# Altium footprint library std-th.PcbLib: 245 footprints (part 1 of 16)
Each footprint in its own frame and in the unit in brackets; x right, y up, seen from the top. Pads: shape width x height; smd on the part's side, far side on the other; paste and mask are expansions set on the pad; w line width, h text height; cw(c..) or ccw(c..) is an arc to the next point about the centre after c.
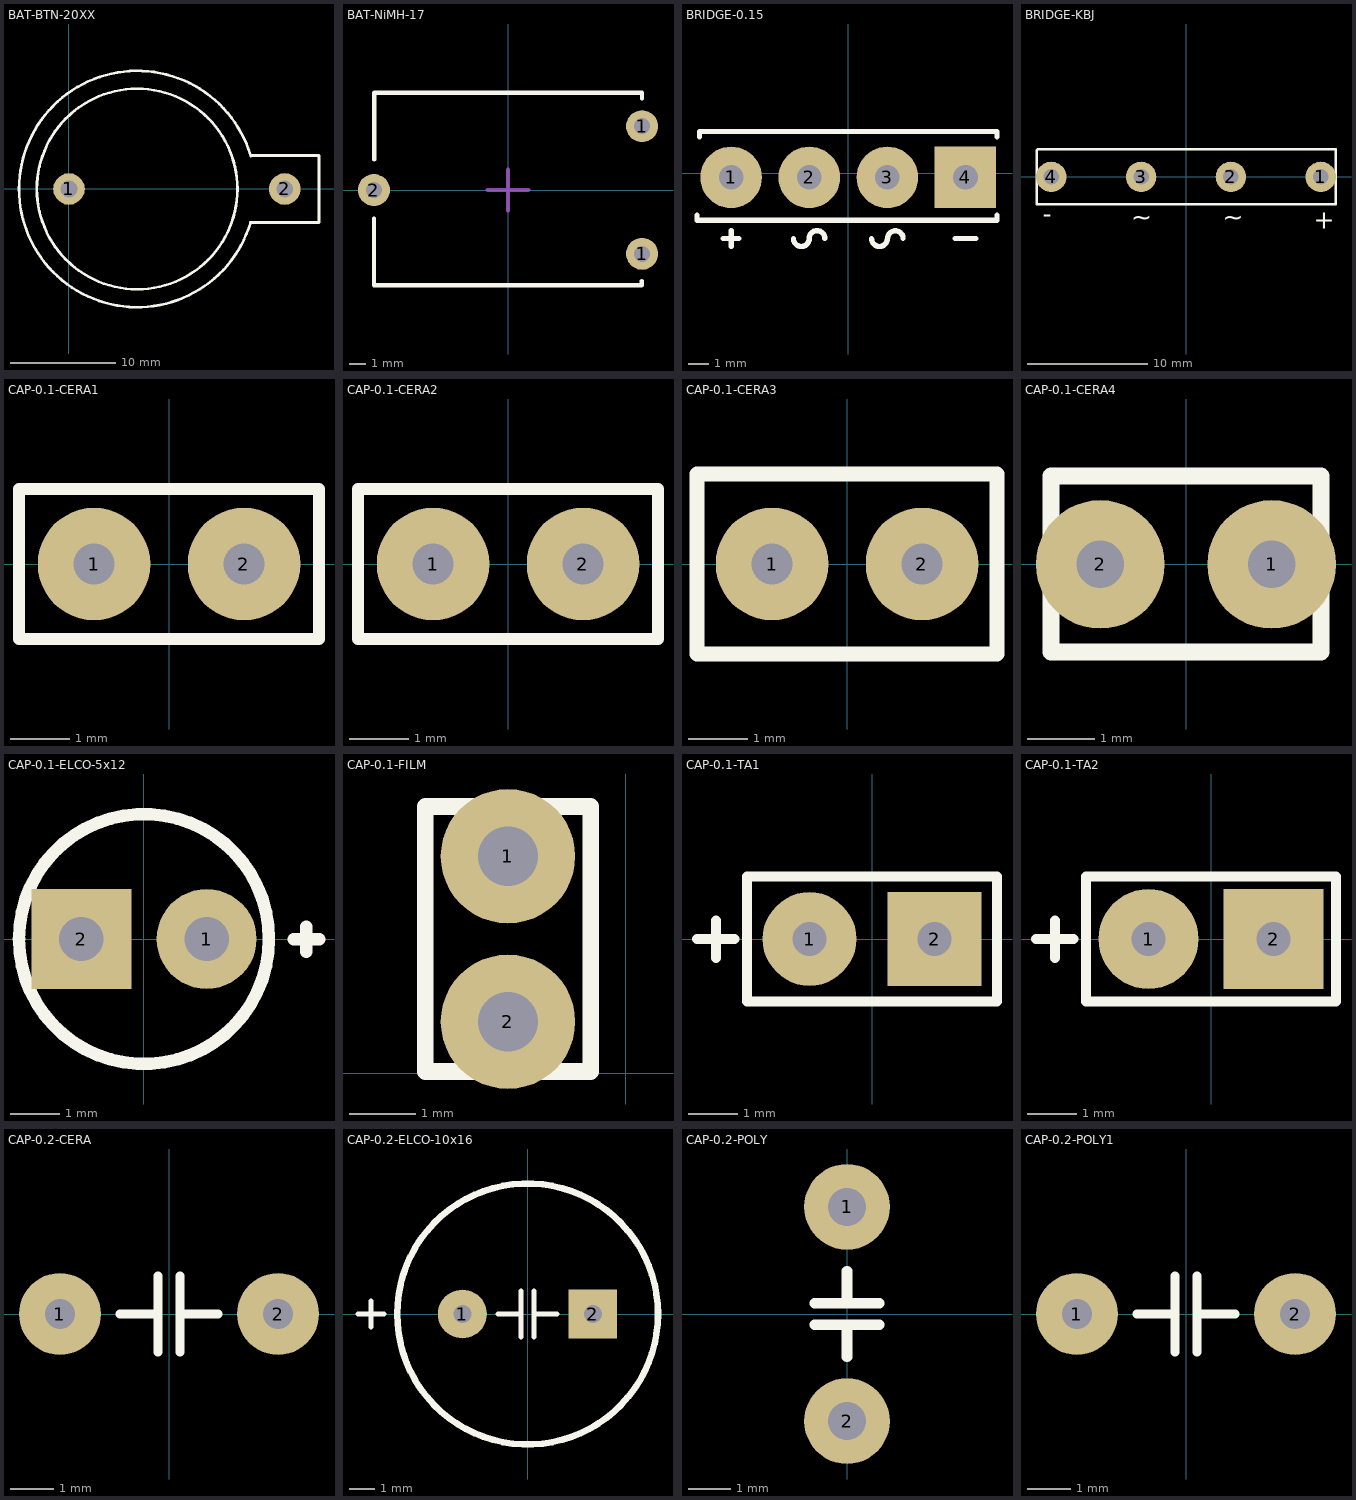
[diagram p0: the footprints below, top view; thin cyan lines are the x and y axes]

## BAT-BTN-20XX [mm] "Battery holder, 2 leads, button cells, 20 mm"
height 50
pads (2):
  round 3 hole 1.6: 1(0,0) 2(20.5,0)
Top Overlay:
  circle w0.254: c6.477,0 r9.525
  lines w0.254: 17.247,-3.168 cw(c6.477,0) 17.256,3.134 ; 17.272,-3.175 23.749,-3.175 23.749,3.175 17.298,3.175
3D body: height 7.15, standoff -3.4, extent -4.898,-11.375 23.802,11.375

## BAT-NiMH-17 [mm] "Battery, rechargeable NiMH, 3 cells, 3.6V"
height 16
pads (3):
  round 2 hole 1: 1(8.4,-4) 1(8.4,4) 2(-8.4,0)
Top Overlay:
  lines w0.254: -8.4,-1.778 -8.4,-5.969 8.382,-5.969 8.382,-5.715 ; -8.382,1.905 -8.382,6.096 8.4,6.096 8.4,5.733
Mechanical 15:
  lines w0.254: -1.27,0 1.27,0 ; 0,-1.27 0,1.27
3D body: height 10.99, standoff 1.01, extent 8.009,-4.98 8.509,4.98
3D body: height 10.99, standoff 1.01, extent -8.4,-4.96 -7.9,5
3D body: height 7, standoff -3, extent -8.896,-0.499 -7.9,0.499
3D body: height 7, standoff -3, extent 7.904,3.501 8.9,4.499
3D body: height 7, standoff -3, extent 7.904,-4.499 8.9,-3.501
3D body: height 11.99, standoff 0.01, extent -7.9,-5.933 -4.9,6.02
3D body: height 11.99, standoff 0.01, extent -2.619,-5.976 0.381,5.976
3D body: height 11.99, standoff 0.01, extent 2.715,-5.976 5.715,5.976
3D body: height 10.99, standoff 1.01, extent -5.207,-4.98 -2.207,4.98
3D body: height 10.99, standoff 1.01, extent 0,-4.98 3,4.98
3D body: height 10.99, standoff 1.01, extent 5.08,-4.98 8.08,4.98

## BRIDGE-0.15 [mm] "Bridge, 150 mil pitch"
pads (4):
  round 3 hole 1.2: 1(-5.703,-0.195) 2(-1.9,-0.195) 3(1.902,-0.195)
  rect 3x3 hole 1.2: 4(5.702,-0.195)
Top Overlay:
  lines w0.254: -7.366,-2.032 -7.366,-2.286 7.239,-2.286 7.239,-2.032 ; -7.239,1.778 -7.239,2.032 7.239,2.032 7.239,1.778 ; -6.096,-3.175 -5.334,-3.175 ; -5.703,-3.556 -5.703,-2.794 ; -2.672,-3.175 ccw(c-2.286,-3.175) -1.9,-3.175 ; -1.905,-3.175 cw(c-1.524,-3.175) -1.143,-3.175 ; 1.131,-3.175 ccw(c1.517,-3.175) 1.902,-3.175 ; 1.914,-3.175 cw(c2.291,-3.175) 2.667,-3.175 ; 5.207,-3.175 6.223,-3.175
3D body: height 14.5, standoff -9.7, extent -7.29,-2.47 7.29,2.54

## BRIDGE-KBJ [mm] "Rectifier bridge, KBJ case, 7.5 mm pitch"
height 20
pads (4):
  round 2.54 hole 1.3: 1(11.25,0) 2(3.75,0) 3(-3.75,0) 4(-11.25,0)
Top Overlay:
  lines w0.203: -12.446,-2.286 -12.432,-2.3 12.5,-2.3 12.5,2.3 -12.392,2.3 -12.446,2.246 -12.446,-2.286
  text "+" at 10.668,-4.318 h1.52
  text "-" at -11.938,-3.81 h1.52
  text "~" at -4.572,-4.064 h1.52
  text "~" at 3.048,-4.064 h1.52
3D body: height 18.5, standoff -14, extent -12.5,-2.3 12.5,2.3

## CAP-0.1-CERA1 [mm] "Capacitor, ceramic, 100 mil pitch"
height 10.16
pads (2):
  round 1.905 hole 0.7: 1(-1.27,0) 2(1.27,0)
Top Overlay:
  lines w0.203: -2.54,-1.27 2.54,-1.27 2.54,1.27 -2.54,1.27 -2.54,-1.27
3D body: height 5.5, standoff -3.33, extent -2.77,-1.25 2.731,1.25

## CAP-0.1-CERA2 [mm] "Capacitor, ceramic, 100 mil pitch"
height 5.08
pads (2):
  round 1.905 hole 0.7: 1(-1.27,0) 2(1.27,0)
Top Overlay:
  lines w0.203: -2.54,-1.27 2.54,-1.27 2.54,1.27 -2.54,1.27 -2.54,-1.27
3D body: height 6.42, standoff -1.5, extent -2.918,-0.848 2.921,0.848

## CAP-0.1-CERA3 [mm] "Capacitor, ceramic, X7R, 100 mil pitch"
height 2.54
pads (2):
  round 1.905 hole 0.7: 1(-1.27,0) 2(1.27,0)
Top Overlay:
  lines w0.254: -2.54,-1.524 2.54,-1.524 2.54,1.524 -2.54,1.524 -2.54,-1.524
3D body: height 5.08, standoff -25.4, extent -2.54,-1.587 2.54,1.588

## CAP-0.1-CERA4 [mm] "Capacitor, ceramic, 100 mil pitch"
height 8
pads (2):
  round 1.905 hole 0.7: 1(1.27,0) 2(-1.27,0)
Top Overlay:
  lines w0.254: -2,-1.3 2,-1.3 2,1.31 -2,1.31 -2,-1.3
3D body: height 4.68, standoff -9.12, extent -2,-1.3 2,1.31

## CAP-0.1-ELCO-5x12 [mil] "Capacitor, electrolytic, 100 mil pitch, 5x12 mm body"
height 472.44
pads (2):
  round 80 hole 35.43: 1(50.11,0)
  rect 80x80 hole 35.43: 2(-50.11,0)
Top Overlay:
  circle w10: c0,0 r99.98
  lines w10: 120,0 140,0 ; 130,-10 130,10
3D body: height 518.83, standoff -75.65, extent -99.91,-99.98 100.01,99.98

## CAP-0.1-FILM [mil] "Capacitor, Film, 100 mil pitch, 2.5x5.5 mm body"
height 216.54
pads (2):
  round 80 hole 35.43: 1(-70.01,129.21) 2(-70.01,30.78)
Top Overlay:
  lines w10: -119.21,1.26 -20.78,1.26 -20.78,158.74 -119.21,158.74 -119.21,1.26
3D body: height 216.54, standoff -118.11, extent -119.21,1.26 -20.78,158.74

## CAP-0.1-TA1 [mm] "Capacitor, Tantalum, through hole, 100 mil pitch"
height 10
pads (2):
  round 1.905 hole 0.7: 1(-1.27,0)
  rect 1.905x1.905 hole 0.7: 2(1.27,0)
Top Overlay:
  lines w0.203: -3.556,0 -2.794,0 ; -3.175,-0.381 -3.175,0.381 ; -2.54,-1.27 -2.54,1.27 2.54,1.27 2.54,-1.27 -2.54,-1.27
3D body: height 12.84, standoff -11.16, extent -2.968,-1.587 2.967,1.588

## CAP-0.1-TA2 [mil] "Radial Cap, Thru-Hole; 2 Leads; 0.2 in Pin Spacing"
height 185.04
pads (2):
  round 80 hole 27.56: 1(-50,0)
  rect 80x80 hole 27.56: 2(50,0)
Top Overlay:
  lines w8: -140,0 -110,0 ; -125,-15 -125,15 ; -100,-50 -100,50 100,50 100,-50 -100,-50
3D body: height 290.83, standoff -64.96, extent -78.09,-78.14 78.16,78.16

## CAP-0.2-CERA [mm] "Capacitor, ceramic, 200 mil pitch"
height 10.16
pads (2):
  round 1.905 hole 0.7: 1(-2.54,0) 2(2.54,0)
Top Overlay:
  lines w0.203: -1.143,0 -0.254,0 ; -0.254,-0.889 -0.254,0.889 ; 0.254,-0.889 0.254,0.889 ; 0.254,0 1.143,0
3D body: height 6.95, standoff -1.55, extent -3.491,-0.848 3.5,0.848

## CAP-0.2-ELCO-10x16 [mm] "Capacitor, Electrolytic, Radial, 5 mm body 10 mm leads"
height 16
pads (2):
  round 1.905 hole 0.7: 1(-2.54,0)
  rect 1.905x1.905 hole 0.7: 2(2.54,0)
Top Overlay:
  circle w0.254: c0,0 r5.08
  lines w0.203: -6.604,0 -5.588,0 ; -6.096,-0.508 -6.096,0.508 ; -1.143,0 -0.254,0 ; -0.254,-0.889 -0.254,0.889 ; 0.254,-0.889 0.254,0.889 ; 0.254,0 1.143,0
3D body: height 16, standoff -19, extent -5,-4.953 5,5.047

## CAP-0.2-POLY [mil] "Capacitor, Polymer, 2 leads, 200 mil pitch"
height 200
pads (2):
  round 80 hole 35.43: 1(0,100) 2(0,-100)
Top Overlay:
  lines w10: -30,-10 30,-10 ; -30,10 30,10 ; 0,-40 0,-10 ; 0,10 0,40
3D body: height 299.21, standoff -181.1, extent -49.2,-147.64 49.22,147.64

## CAP-0.2-POLY1 [mm] "Capacitor, polyester, 200 mil pitch"
height 10.16
pads (2):
  round 1.905 hole 0.7: 1(-2.54,0) 2(2.54,0)
Top Overlay:
  lines w0.203: -1.143,0 -0.254,0 ; -0.254,-0.889 -0.254,0.889 ; 0.254,-0.889 0.254,0.889 ; 0.254,0 1.143,0
3D body: height 7.62, standoff -2, extent -2.794,-1.587 2.794,1.588